# Altium footprint library Socket.PcbLib: 38 footprints (part 3 of 3)
Each footprint in its own frame and in the unit in brackets; x right, y up, seen from the top. Pads: shape width x height; smd on the part's side, far side on the other; paste and mask are expansions set on the pad; w line width, h text height; cw(c..) or ccw(c..) is an arc to the next point about the centre after c.
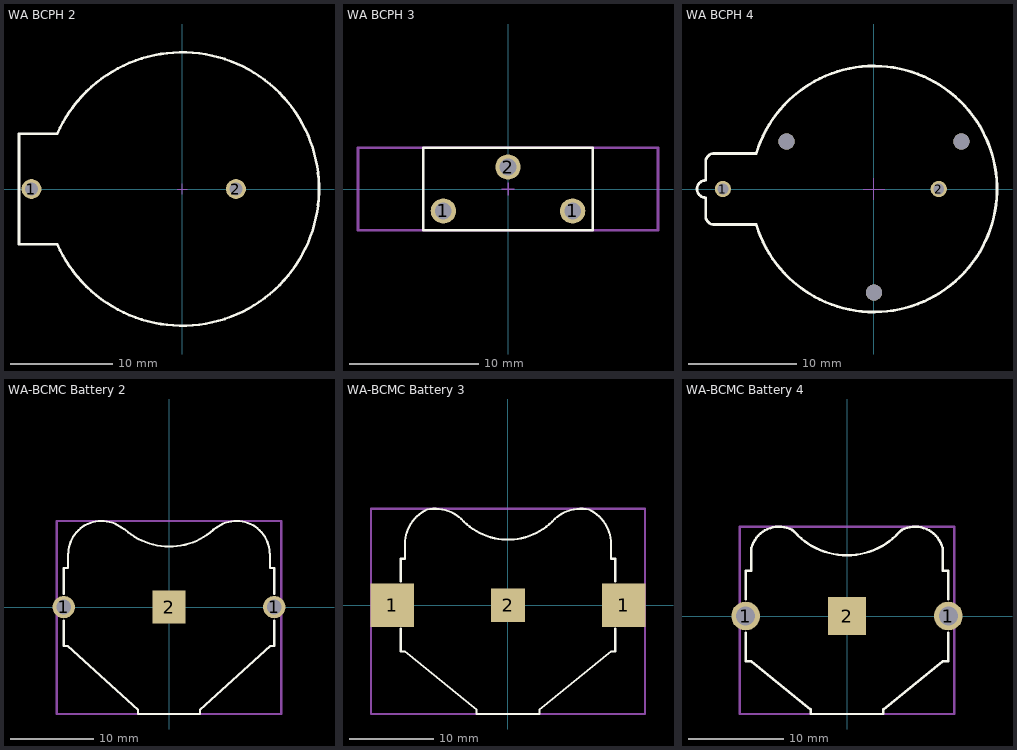
[diagram p2: the footprints below, top view; thin cyan lines are the x and y axes]

## WA BCPH 2 [mm] "Battery Holder"
height 9.5
pads (2):
  round 1.95 hole 1.3: 1(-14.755,0) 2(5.245,0)
Top Overlay:
  lines w0.254: -12.236,-5.4 ccw(c0,0) -12.237,5.399 ; -12.237,5.4 -15.975,5.4 -15.975,-5.4 -12.236,-5.4
Mechanical 15:
  lines w0.1: -0.5,0 0.5,0 ; 0,-0.5 0,0.5
3D body "79578211.stp": height 9.6, standoff -3.2, extent -15.97,-13.375 13.375,13.375

## WA BCPH 3 [mm] "Battery Holder"
height 18.1
pads (3):
  round 1.95 hole 1.3: 1(-5,-1.7) 1(5,-1.7) 2(0,1.7)
Top Overlay:
  lines w0.2: -6.55,-3.2 6.55,-3.2 6.55,3.2 -6.55,3.2 -6.55,-3.2
Mechanical 15:
  lines w0.1: -0.5,0 0.5,0 ; 0,-0.5 0,0.5
  lines w0.2: -11.6,-3.2 -11.6,3.2 11.6,3.2 11.6,-3.2 -11.6,-3.2
3D body "79548211.stp": height 18.2, standoff -2.9, extent -11.242,-3.2 11.243,3.2

## WA BCPH 4 [mm] "Battery Holder"
height 8.8
pads (5):
  round 1.5 hole 1: 1(-14,0) 2(6,0)
  round 1.5 hole 1.5 unplated: ""(-8.1,4.4) ""(0,-9.6) ""(8.1,4.4)
Top Overlay:
  lines w0.254: -10.912,-3.3 ccw(c-10.912,-3.3) -10.912,-3.3 ; -10.912,-3.3 ccw(c0,0) -10.912,3.3 ; -10.912,-3.3 -14.8,-3.3 cw(c-14.8,-2.5) -15.6,-2.5 -15.6,-0.8 cw(c-15.6,0) -15.6,0.8 -15.6,2.5 cw(c-14.8,2.5) -14.8,3.3 -10.912,3.3 ; -10.912,3.3 ccw(c-10.912,3.3) -10.912,3.3
Mechanical 15:
  lines w0.1: -1,0 1,0 ; 0,-1 0,1
3D body "79528211.stp": height 8.5, standoff -3.3, extent -16.393,-11.4 11.4,11.4

## WA-BCMC Battery 2 [mm] "Battery Holder, Battery"
height 3.7
pads (3):
  round 2.7 hole 1.8: 1(-12.7,0) 1(12.7,0)
  rect 4x4 smd: 2(0,0)
Top Overlay:
  lines w0.254: -12.7,-1.6 -12.7,-4.7 -12.2,-4.7 -3.744,-12.394 ; -12.7,1.6 -12.7,4.7 -12.2,4.7 -12.2,6.2 ; -12.187,6.2 cw(c-9.3,6.1) -12.145,6.597 cw(c-8.15,6.4) -5.953,9.743 ccw(c-4.45,11.8) -5.629,9.541 ccw(c-4.125,11.598) -5.304,9.339 ; -5.296,9.348 ccw(c0.05,15.3) 5.34,9.299 ; -3.75,-12.4 -3.75,-12.9 3.75,-12.9 3.75,-12.4 ; 3.744,-12.394 12.2,-4.7 12.7,-4.7 12.7,-1.6 ; 5.304,9.339 ccw(c4.125,11.598) 5.629,9.541 ccw(c4.45,11.8) 5.953,9.743 cw(c8.15,6.4) 12.145,6.597 cw(c9.3,6.1) 12.187,6.2 ; 12.2,6.2 12.2,4.7 12.7,4.7 12.7,1.6
Mechanical 13:
  lines w0.254: -13.55,-12.9 -13.55,10.4 13.55,10.4 13.55,-12.9 -13.55,-12.9
3D body "79573231.stp": height 3.8, standoff -2.9, extent -13.553,-12.9 13.546,10.4

## WA-BCMC Battery 3 [mm] "Battery Holder, Battery"
height 2.8
pads (3):
  rect 5.2x5.2 smd: 1(-13.815,0) 1(13.815,0)
  rect 4x4 smd: 2(0,0)
Top Overlay:
  lines w0.254: -12.8,-2.83 -12.8,-5.52 -12.3,-5.52 -3.749,-12.494 ; -12.8,2.83 -12.8,5.52 -12.3,5.52 -12.3,7.3 cw(c-7.8,7.3) -9.671,11.393 ; -9.668,11.388 cw(c-8.67,7) -5.599,10.289 ; -5.588,10.298 ccw(c0,15.3) 5.588,10.298 ; -3.75,-12.496 -3.75,-12.996 3.75,-12.996 3.75,-12.496 ; 3.749,-12.494 12.3,-5.52 12.8,-5.52 12.8,-2.83 ; 5.599,10.289 cw(c8.67,7) 9.668,11.388 ; 9.671,11.393 cw(c7.8,7.3) 12.3,7.3 12.3,5.52 12.8,5.52 12.8,2.83
Mechanical 13:
  lines w0.254: -16.35,-13 -16.35,11.5 16.35,11.5 16.35,-13 -16.35,-13
3D body "79573131.stp": height 3.9, standoff 0.05, extent -16.35,-12.996 16.35,11.504

## WA-BCMC Battery 4 [mm] "Battery Holder, Battery"
height 3.8
pads (3):
  round 3 hole 2: 1(-10.6,0) 1(10.6,0)
  rect 4x4 smd: 2(0,0)
Top Overlay:
  lines w0.254: -10.6,-1.73 -10.6,-4.75 -10,-4.75 -3.81,-9.762 -3.81,-10.25 3.81,-10.25 3.81,-9.762 10,-4.75 10.6,-4.75 10.6,-1.73 ; -10.6,1.73 -10.6,4.75 -10,4.75 -10,7.126 ; -9.998,7.126 cw(c-7.1,6.35) -5.737,9.023 ; -5.709,8.991 ccw(c-4.45,10.15) -5.469,8.775 ; -5.471,8.772 ccw(c0,13.74) 5.471,8.772 ; 5.469,8.775 ccw(c4.45,10.15) 5.709,8.991 ; 5.737,9.023 cw(c7.1,6.35) 9.998,7.126 ; 10,7.126 10,4.75 10.6,4.75 10.6,1.73
Mechanical 13:
  lines w0.254: -11.2,-10.25 -11.2,9.35 11.2,9.35 11.2,-10.25 -11.2,-10.25
3D body "79523211.stp": height 4.02, standoff -2.1, extent -11.298,-10.25 11.298,9.35